# Altium integrated library mod_x_cb_g3399.IntLib: 16 symbols
Pins are listed as number, name and electrical type; pins without a type are passive.

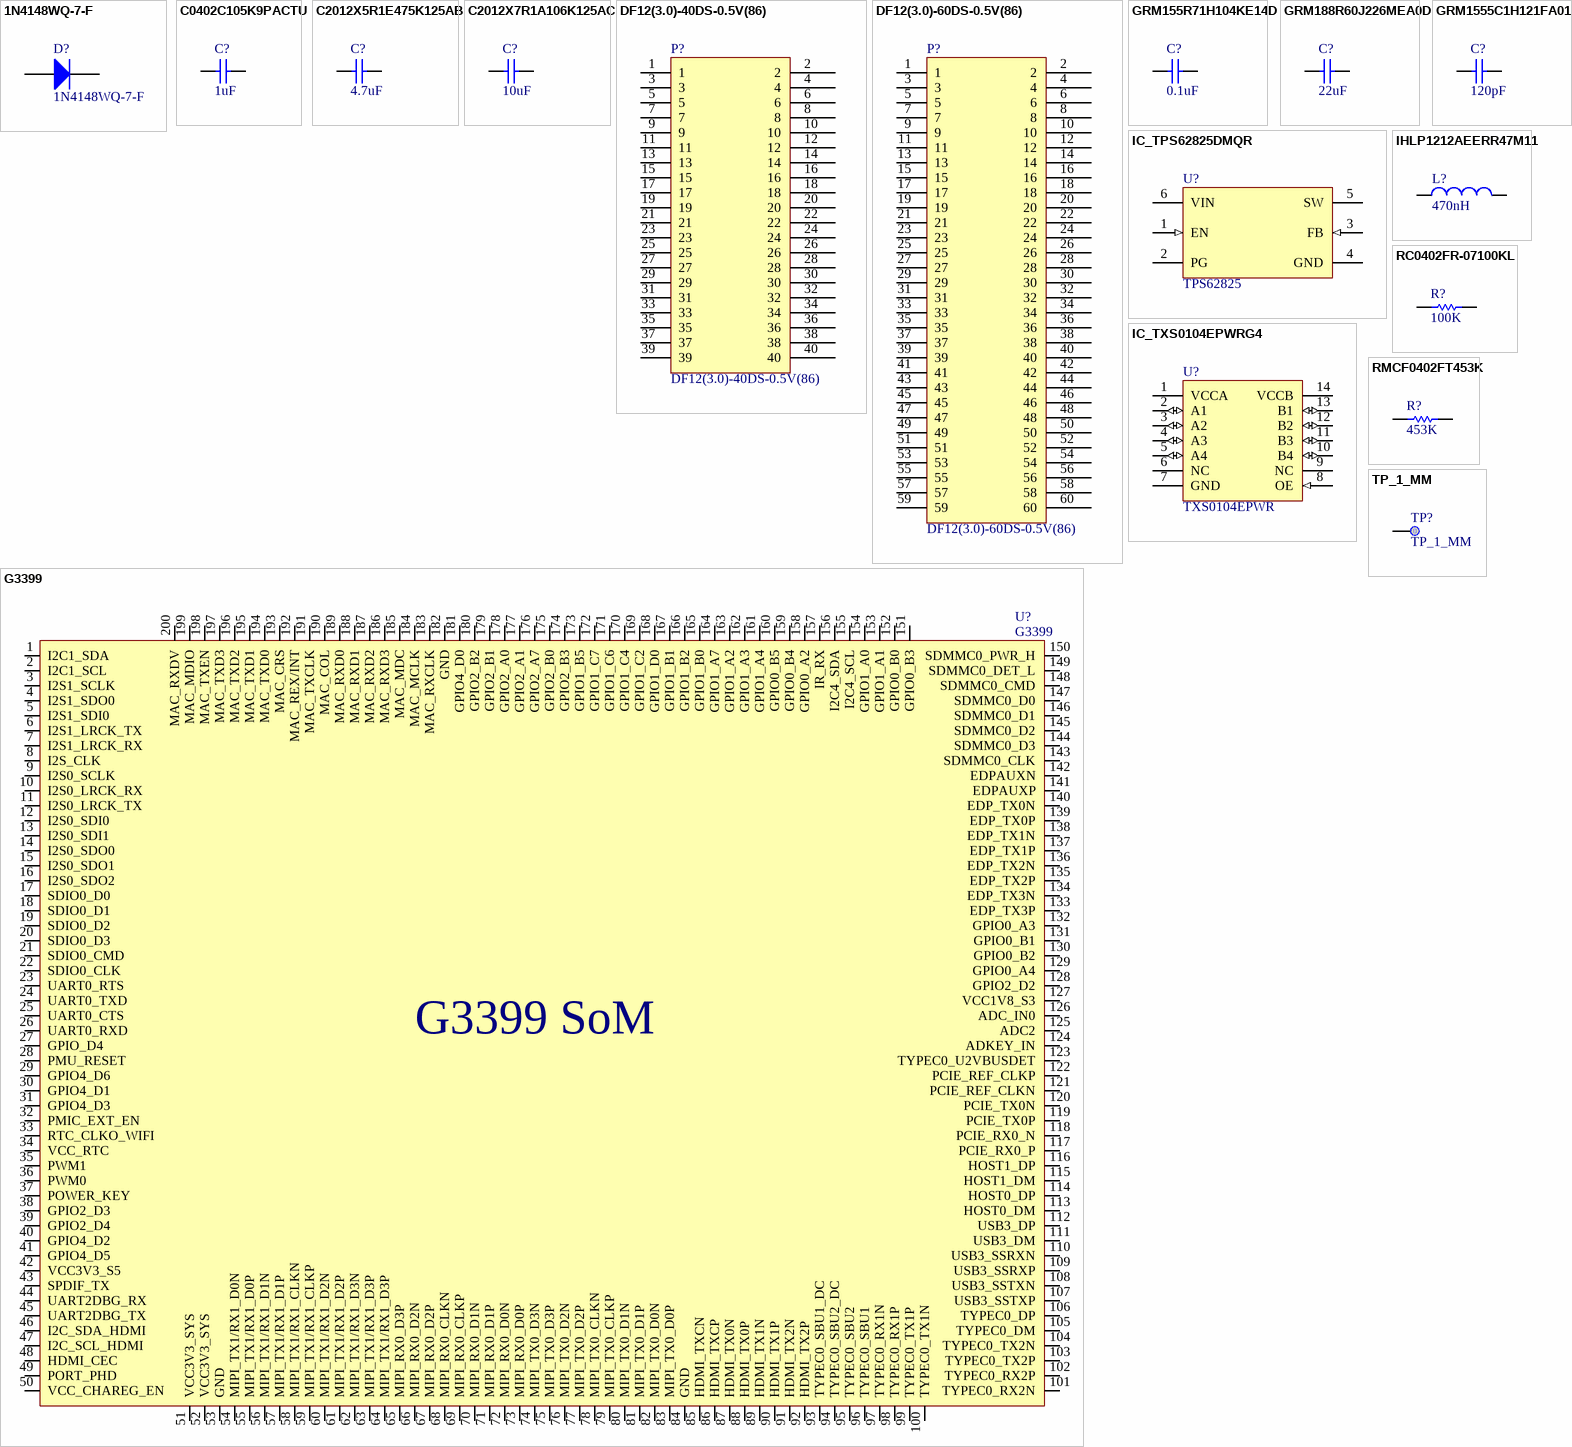
[diagram p0: symbols 1N4148WQ-7-F to TP_1_MM]

## 1N4148WQ-7-F
designator D?
DIODE GEN PURP 100V 300MA SOD123; Manufacturer 1: Diodes Zetex; Max Surge Current: 2A; Forward Voltage: 1.25V; Element Configuration: Single; Recovery Time: 4ns; Peak Reverse Current: 50uA; Max Power Dissipation: 400mW; Supplier 1: Digi-Key; Manufacturer Part Number 1: 1N4148WQ-7-F; Stock 1: 65303; Pricing 1: 1=0.22, 10=0.196, 100=0.107, 500=0.06582, 1000=0.04488 (USD); Mount: Surface Mount; Case/Package: SOD-123-2; Number of Pins: 2; Weight: 0.000353oz; Contact Plating: Matte,Tin; Min Operating Temperature: -65°C; Max Operating Temperature: 150°C; Packaging: Tape and Reel; Peak Non-Repetitive Surge Current: 2A; Forward Current: 300mA; Package Quantity: 3000; Reverse Recovery Time: 4ns; Max Repetitive Reverse Voltage (Vrrm): 100V; Lead Free: Lead Free; Supplier Part Number 1: 1N4148WQ-7-FDICT-ND
footprint SOD123
pins: 1 K, 2 A

## C0402C105K9PACTU
designator C?, comment 1uF
CAP CER 1UF 6.3V X5R 0402; Manufacturer 1: KEMET; Manufacturer Part Number 1: C0402C105K9PACTU; Product Training Modules: Capacitor Basics- Typical Uses for Capacitors; Capacitance: 1µF; Tolerance: ±10%; Online Catalog: X5R Dielectric (Commercial Grade); Kits: 399-5085-ND  - KIT CER HI CAPACITANCE CHIP CAPS; Other Names: 399-4873-1; Supplier 1: Digi-Key; Description 1: CAP CER 1UF 6.3V X5R 0402; Stock 1: 0; Pricing 1: 1=0.1, 10=0.022, 100=0.0097, 500=0.007, 1000=0.0055, 2500=0.005, 5000=0.0046 (USD); Standard Package: 1; Category: Capacitors; Family: Ceramic Capacitors; Series: C; Packaging: Cut Tape (CT); Voltage - Rated: 6.3V; Temperature Coefficient: X5R; Mounting Type: Surface Mount, MLCC; Operating Temperature: -55°C ~ 85°C; Applications: General Purpose; Ratings: -; Package / Case: 0402 (1005 Metric); Size / Dimension: 0.039" L x 0.020" W (1.00mm x 0.50mm); Height - Seated (Max): -; Thickness (Max): 0.022" (0.55mm); Lead Spacing: -; Features: -; Lead Style: -; ComponentLink1URL: https://datasheet.ciiva.com/144/docfinderpartnumber-c0402c105k9pactu-144529.pdf; ComponentLink1Description: https://datasheet.ciiva.com/144/docfinderpartnumber-c0402c105k9pactu-144529.pdf; ComponentLink2URL: https://datasheet.ciiva.com/28645/1789732-28645392.pdf; ComponentLink2Description: https://datasheet.ciiva.com/28645/1789732-28645392.pdf; ComponentLink3URL: https://datasheet.ciiva.com/7747/40889-7747623.pdf; ComponentLink3Description: https://datasheet.ciiva.com/7747/40889-7747623.pdf; ComponentLink4URL: https://datasheet.ciiva.com/18192/getdatasheetpartid-127800-18192427.pdf; ComponentLink4Description: https://datasheet.ciiva.com/18192/getdatasheetpartid-127800-18192427.pdf; ComponentLink5URL: https://datasheet.ciiva.com/7747/kem-c1006-x5r-smd-7747445.pdf; ComponentLink5Description: https://datasheet.ciiva.com/7747/kem-c1006-x5r-smd-7747445.pdf; ComponentLink6URL: https://datasheet.ciiva.com/5414/kem-c1006-x5r-smd-5414919.pdf; ComponentLink6Description: https://datasheet.ciiva.com/5414/kem-c1006-x5r-smd-5414919.pdf; Supplier Part Number 1: 399-4873-1-ND
footprint CAPC1005N (Chip Capacitor, Body 1.0x0.5mm, IPC Medium Density)
footprint CAPC1005L
pins: 1, 2

## C2012X5R1E475K125AB
designator C?, comment 4.7uF
CAP CER 4.7UF 25V X5R 0805; Manufacturer 1: TDK; Manufacturer Part Number 1: C2012X5R1E475K125AB; Dielectric Material: Ceramic; Tolerance: 10%; Supplier 1: Digi-Key; Stock 1: 20000; Pricing 1: 1=0.38, 10=0.259, 100=0.1466, 500=0.1035, 1000=0.09056 (USD); Mount: Surface Mount; Case/Package: 0805; Number of Pins: 2; Weight: 0.000194oz; Case Code (Imperial): 0805; Case Code (Metric): 2012; Min Operating Temperature: -55°C; Max Operating Temperature: 85°C; Capacitance: 4.7uF; Dielectric: X5R; Voltage Rating: 25V; Voltage Rating (DC): 25V; Packaging: Tape and Reel; Package Quantity: 1; Termination: SMD/SMT; Composition: Ceramic; Voltage: 25V; Length: 2mm; Height: 1.25mm; Depth: 1.25mm; Width: 1.25mm; Thickness: 0.057inch; Radiation Hardening: No; REACH SVHC: No SVHC; Lead Free: Lead Free; ComponentLink1URL: https://datasheet.ciiva.com/24216/tdkmlcccaprange-24216480.pdf; ComponentLink1Description: https://datasheet.ciiva.com/24216/tdkmlcccaprange-24216480.pdf; ComponentLink2URL: https://datasheet.ciiva.com/11788/0900766b80c1bb00-11788107.pdf; ComponentLink2Description: https://datasheet.ciiva.com/11788/0900766b80c1bb00-11788107.pdf; ComponentLink3URL: https://datasheet.ciiva.com/36857/1796654-36857301.pdf; ComponentLink3Description: https://datasheet.ciiva.com/36857/1796654-36857301.pdf; ComponentLink4URL: https://datasheet.ciiva.com/22773/1571323-22773430.pdf; ComponentLink4Description: https://datasheet.ciiva.com/22773/1571323-22773430.pdf; ComponentLink5URL: https://datasheet.ciiva.com/6251/tdkmlcccaprange-6251817.pdf; ComponentLink5Description: https://datasheet.ciiva.com/6251/tdkmlcccaprange-6251817.pdf; ComponentLink6URL: https://datasheet.ciiva.com/22676/1571323-22676937.pdf; ComponentLink6Description: https://datasheet.ciiva.com/22676/1571323-22676937.pdf; ComponentLink7URL: https://datasheet.ciiva.com/6251/tdkmlcccaprange-6251820.pdf; ComponentLink7Description: https://datasheet.ciiva.com/6251/tdkmlcccaprange-6251820.pdf; ComponentLink8URL: https://datasheet.ciiva.com/28602/1744655-28602173.pdf; ComponentLink8Description: https://datasheet.ciiva.com/28602/1744655-28602173.pdf; ComponentLink9URL: https://datasheet.ciiva.com/6251/tdkmlcccaprange-6251823.pdf; ComponentLink9Description: https://datasheet.ciiva.com/6251/tdkmlcccaprange-6251823.pdf; ComponentLink10URL: https://datasheet.ciiva.com/16449/e412-c-16449599.pdf; ComponentLink10Description: https://datasheet.ciiva.com/16449/e412-c-16449599.pdf; Supplier Part Number 1: 445-4116-1-ND
footprint CAPC2012N (Chip Capacitor, Body 2.0x1.3mm, IPC Medium Density)
pins: 1, 2

## C2012X7R1A106K125AC
designator C?, comment 10uF
CAP CER 10UF 10V X7R 0805; Manufacturer 1: TDK; Manufacturer Part Number 1: C2012X7R1A106K125AC; Dielectric Material: Ceramic; Tolerance: 10%; Supplier 1: Digi-Key; Stock 1: 20000; Pricing 1: 1=0.52, 10=0.359, 100=0.2156, 500=0.16172, 1000=0.13656 (USD); Mount: Surface Mount; Case/Package: 0805; Number of Pins: 2; Weight: 0.000194oz; Case Code (Metric): 2012; Case Code (Imperial): 0805; Contact Plating: Matte,Tin; Min Operating Temperature: -55°C; Max Operating Temperature: 125°C; Capacitance: 10uF; Dielectric: X7R; Voltage Rating: 10V; Packaging: Tape and Reel; Voltage Rating (DC): 10V; Termination: SMD/SMT; Package Quantity: 1; Composition: Ceramic; Voltage: 10V; Length: 2mm; Height: 1.25mm; Width: 0.049inch; Depth: 1.25mm; Thickness: 0.057inch; Radiation Hardening: No; Lead Free: Lead Free; REACH SVHC: No SVHC; Supplier Part Number 1: 445-6857-1-ND
footprint CAPC2012N (Chip Capacitor, Body 2.0x1.3mm, IPC Medium Density)
pins: 1, 2

## DF12(3.0)-40DS-0.5V(86)
designator P?
CONN RECEPT 40POS 3MM SMD 0.5MM; Manufacturer 1: Hirose; Number of Contacts: 40; Current Rating: 300mA; Voltage Rating: 50V; Gender: Receptacle; Contact Resistance: 50mR; Row Spacing: 2.4mm; Supplier 1: Digi-Key; Manufacturer Part Number 1: DF12(3.0)-40DS-0.5V(86); Stock 1: 9904; Pricing 1: 1=1.44, 10=1.262, 25=1.188, 50=1.1386, 100=1.089, 250=0.99, 500=0.891 (USD); Mount: Surface Mount; Contact Plating: Gold; Contact Material: Copper; Housing Colour: Beige; Housing Material: Polyamide; Insulation Material: Nylon; Min Operating Temperature: -45°C; Max Operating Temperature: 125°C; Number of Rows: 2; Termination: SMD/SMT; Packaging: Tape and Reel; Package Quantity: 1000; Number of Positions: 40; Orientation: Straight; Connector Type: Receptacle; Max Current Rating: 300mA; Max Voltage Rating (AC): 50V; Length: 13mm; Pitch: 0.5mm; Mated Stacking Heights: 3mm; Stack Height: 3mm; Depth: 3.6mm; Radiation Hardening: No; Lead Free: Lead Free; Flammability Rating: UL94 V-0; REACH SVHC: No SVHC; Supplier Part Number 1: H11706CT-ND
footprint DF12-40
pins: 1, 2, 3, 4, 5, 6, 7, 8, 9, 10, 11, 12, 13, 14, 15, 16, 17, 18, 19, 20, 21, 22, 23, 24, 25, 26, 27, 28, 29, 30, 31, 32, 33, 34, 35, 36, 37, 38, 39, 40

## DF12(3.0)-60DS-0.5V(86)
designator P?
CONN RECEPT 60POS 3MM SMD 0.5MM; Manufacturer 1: Hirose; Number of Contacts: 60; Current Rating: 300mA; Voltage Rating: 50V; Gender: Receptacle; Contact Resistance: 50mR; Mating Cycles: 50; Insulation Resistance: 500MR; Row Spacing: 2.4mm; Supplier 1: Digi-Key; Manufacturer Part Number 1: DF12(3.0)-60DS-0.5V(86); Stock 1: 7229; Pricing 1: 1=1.87, 10=1.698, 25=1.594, 50=1.5246, 100=1.4553, 250=1.31672, 500=1.21276 (USD); Mount: Surface Mount; Contact Plating: Gold; Contact Material: Copper,Copper Alloy; Housing Colour: Beige; Housing Material: Polyamide; Insulation Material: Nylon; Colour: Beige; Min Operating Temperature: -45°C; Max Operating Temperature: 125°C; Number of Rows: 2; Termination: Solder; Packaging: Tape and Reel; Package Quantity: 1; Number of Positions: 60; Orientation: Straight; Max Current Rating: 300mA; Max Voltage Rating (AC): 50V; Voltage Rating (AC): 50V; Connector Type: Receptacle; Length: 18mm; Pitch: 0.5mm; Stack Height: 3mm; Mated Stacking Heights: 3mm; Depth: 3.6mm; Lead Pitch: 0.5mm; Width: 18mm; Radiation Hardening: No; Flammability Rating: UL94 V-0; REACH SVHC: No SVHC; Lead Free: Lead Free; Supplier Part Number 1: H5207CT-ND
footprint DF12-60
pins: 1, 2, 3, 4, 5, 6, 7, 8, 9, 10, 11, 12, 13, 14, 15, 16, 17, 18, 19, 20, 21, 22, 23, 24, 25, 26, 27, 28, 29, 30, 31, 32, 33, 34, 35, 36, 37, 38, 39, 40, 41, 42, 43, 44, 45, 46, 47, 48, 49, 50, 51, 52, 53, 54, 55, 56, 57, 58, 59, 60

## G3399
designator U?
ROCKCHIP R3399 SoM
footprint G3399-MOD
pins: 1 I2C1_SDA, 2 I2C1_SCL, 3 I2S1_SCLK, 4 I2S1_SDO0, 5 I2S1_SDI0, 6 I2S1_LRCK_TX, 7 I2S1_LRCK_RX, 8 I2S_CLK, 9 I2S0_SCLK, 10 I2S0_LRCK_RX, 11 I2S0_LRCK_TX, 12 I2S0_SDI0, 13 I2S0_SDI1, 14 I2S0_SDO0, 15 I2S0_SDO1, 16 I2S0_SDO2, 17 SDIO0_D0, 18 SDIO0_D1, 19 SDIO0_D2, 20 SDIO0_D3, 21 SDIO0_CMD, 22 SDIO0_CLK, 23 UART0_RTS, 24 UART0_TXD, 25 UART0_CTS, 26 UART0_RXD, 27 GPIO_D4, 28 PMU_RESET, 29 GPIO4_D6, 30 GPIO4_D1, 31 GPIO4_D3, 32 PMIC_EXT_EN, 33 RTC_CLKO_WIFI, 34 VCC_RTC, 35 PWM1, 36 PWM0, 37 POWER_KEY, 38 GPIO2_D3, 39 GPIO2_D4, 40 GPIO4_D2, 41 GPIO4_D5, 42 VCC3V3_S5, 43 SPDIF_TX, 44 UART2DBG_RX, 45 UART2DBG_TX, 46 I2C_SDA_HDMI, 47 I2C_SCL_HDMI, 48 HDMI_CEC, 49 PORT_PHD, 50 VCC_CHAREG_EN, 51 VCC3V3_SYS, 52 VCC3V3_SYS, 53 GND, 54 MIPI_TX1/RX1_D0N, 55 MIPI_TX1/RX1_D0P, 56 MIPI_TX1/RX1_D1N, 57 MIPI_TX1/RX1_D1P, 58 MIPI_TX1/RX1_CLKN, 59 MIPI_TX1/RX1_CLKP, 60 MIPI_TX1/RX1_D2N, 61 MIPI_TX1/RX1_D2P, 62 MIPI_TX1/RX1_D3N, 63 MIPI_TX1/RX1_D3P, 64 MIPI_TX1/RX1_D3P, 65 MIPI_RX0_D3P, 66 MIPI_RX0_D2N, 67 MIPI_RX0_D2P, 68 MIPI_RX0_CLKN, 69 MIPI_RX0_CLKP, 70 MIPI_RX0_D1N, 71 MIPI_RX0_D1P, 72 MIPI_RX0_D0N, 73 MIPI_RX0_D0P, 74 MIPI_TX0_D3N, 75 MIPI_TX0_D3P, 76 MIPI_TX0_D2N, 77 MIPI_TX0_D2P, 78 MIPI_TX0_CLKN, 79 MIPI_TX0_CLKP, 80 MIPI_TX0_D1N, 81 MIPI_TX0_D1P, 82 MIPI_TX0_D0N, 83 MIPI_TX0_D0P, 84 GND, 85 HDMI_TXCN, 86 HDMI_TXCP, 87 HDMI_TX0N, 88 HDMI_TX0P, 89 HDMI_TX1N, 90 HDMI_TX1P, 91 HDMI_TX2N, 92 HDMI_TX2P, 93 TYPEC0_SBU1_DC, 94 TYPEC0_SBU2_DC, 95 TYPEC0_SBU2, 96 TYPEC0_SBU1, 97 TYPEC0_RX1N, 98 TYPEC0_RX1P, 99 TYPEC0_TX1P, 100 TYPEC0_TX1N, 101 TYPEC0_RX2N, 102 TYPEC0_RX2P, 103 TYPEC0_TX2P, 104 TYPEC0_TX2N, 105 TYPEC0_DM, 106 TYPEC0_DP, 107 USB3_SSTXP, 108 USB3_SSTXN, 109 USB3_SSRXP, 110 USB3_SSRXN, 111 USB3_DM, 112 USB3_DP, 113 HOST0_DM, 114 HOST0_DP, 115 HOST1_DM, 116 HOST1_DP, 117 PCIE_RX0_P, 118 PCIE_RX0_N, 119 PCIE_TX0P, 120 PCIE_TX0N, 121 PCIE_REF_CLKN, 122 PCIE_REF_CLKP, 123 TYPEC0_U2VBUSDET, 124 ADKEY_IN, 125 ADC2, 126 ADC_IN0, 127 VCC1V8_S3, 128 GPIO2_D2, 129 GPIO0_A4, 130 GPIO0_B2, 131 GPIO0_B1, 132 GPIO0_A3, 133 EDP_TX3P, 134 EDP_TX3N, 135 EDP_TX2P, 136 EDP_TX2N, 137 EDP_TX1P, 138 EDP_TX1N, 139 EDP_TX0P, 140 EDP_TX0N, 141 EDPAUXP, 142 EDPAUXN, 143 SDMMC0_CLK, 144 SDMMC0_D3, 145 SDMMC0_D2, 146 SDMMC0_D1, 147 SDMMC0_D0, 148 SDMMC0_CMD, 149 SDMMC0_DET_L, 150 SDMMC0_PWR_H, 151 GPIO0_B3, 152 GPIO0_B0, 153 GPIO1_A1, 154 GPIO1_A0, 155 I2C4_SCL, 156 I2C4_SDA, 157 IR_RX, 158 GPIO0_A2, 159 GPIO0_B4, 160 GPIO0_B5, 161 GPIO1_A4, 162 GPIO1_A3, 163 GPIO1_A2, 164 GPIO1_A7, 165 GPIO1_B0, 166 GPIO1_B2, 167 GPIO1_B1, 168 GPIO1_D0, 169 GPIO1_C2, 170 GPIO1_C4, 171 GPIO1_C6, 172 GPIO1_C7, 173 GPIO1_B5, 174 GPIO2_B3, 175 GPIO2_B0, 176 GPIO2_A7, 177 GPIO2_A1, 178 GPIO2_A0, 179 GPIO2_B1, 180 GPIO2_B2, 181 GPIO4_D0, 182 GND, 183 MAC_RXCLK, 184 MAC_MCLK, 185 MAC_MDC, 186 MAC_RXD3, 187 MAC_RXD2, 188 MAC_RXD1, 189 MAC_RXD0, 190 MAC_COL, 191 MAC_TXCLK, 192 MAC_REX/INT, 193 MAC_CRS, 194 MAC_TXD0, 195 MAC_TXD1, 196 MAC_TXD2, 197 MAC_TXD3, 198 MAC_TXEN, 199 MAC_MDIO, 200 MAC_RXDV
text: G3399 SoM

## GRM155R71H104KE14D
designator C?, comment 0.1uF
CAP CER 0.1UF 50V X7R 0402; Manufacturer 1: Murata; Manufacturer Part Number 1: GRM155R71H104KE14D; Description 1: Cap Ceramic 0.1uF 50V X7R 10% SMD 0402 125C Paper T/R; Voltage Rating DC: 50 VDC; Tolerance: 10 %; Brand: Murata Electronics; Capacitance - nF: 100 nF; Capacitance - pF: 100000 pF; Class: Class 2; Type: General Purpose Ceramic Capacitors; Unit Weight: 0.000212 oz; Supplier 1: Digi-Key; Stock 1: 0; Pricing 1: 1=0.1, 10=0.022, 100=0.0099, 500=0.0071, 1000=0.0056, 2500=0.0051, 5000=0.0047 (USD); Product Category: Multilayer Ceramic Capacitors MLCC - SMD/SMT; RoHS: True; Capacitance: 0.1 uF; Dielectric: X7R; Case Code - in: 0402; Case Code - mm: 1005; Height: 0.5 mm; Maximum Operating Temperature: + 125 C; Minimum Operating Temperature: - 55 C; Product: General Type MLCCs; Series: GRM; Packaging: Reel; Length: 1 mm; Package / Case: 0402 (1005 metric); Factory Pack Quantity: 10000; Termination Style: SMD/SMT; Width: 0.5 mm; ComponentLink1URL: http://components.arrow.com/part/dataview/0323_07030614; ComponentLink1Description: http://components.arrow.com/part/dataview/0323_07030614; ComponentLink2URL: http://psearch.en.murata.com/capacitor/product/GRM155R71H104KE14%23.pdf; ComponentLink2Description: http://psearch.en.murata.com/capacitor/product/GRM155R71H104KE14%23.pdf; ComponentLink3URL: http://www.mouser.com/ds/2/281/c02e-2905.pdf; ComponentLink3Description: http://www.mouser.com/ds/2/281/c02e-2905.pdf; ComponentLink4URL: http://search.murata.co.jp/Ceramy/image/img/A01X/partnumbering_e_01.pdf; ComponentLink4Description: http://search.murata.co.jp/Ceramy/image/img/A01X/partnumbering_e_01.pdf; ComponentLink5URL: http://www.farnell.com/datasheets/2079156.pdf; ComponentLink5Description: http://www.farnell.com/datasheets/2079156.pdf; Supplier Part Number 1: 490-10700-1-ND
footprint CAPC1005N (Chip Capacitor, Body 1.0x0.5mm, IPC Medium Density)
pins: 1, 2

## GRM188R60J226MEA0D
designator C?, comment 22uF
CAP CER 22UF 6.3V X5R 0603; Manufacturer 1: Murata; Manufacturer Part Number 1: GRM188R60J226MEA0D; Tolerance: 20%; Supplier 1: Digi-Key; Stock 1: 40000; Pricing 1: 1=0.26, 10=0.177, 100=0.1001, 500=0.07066, 1000=0.06182 (USD); Mount: Surface Mount; Case/Package: 0603; Weight: 0.000222oz; Case Code (Metric): 1608; Case Code (Imperial): 0603; Min Operating Temperature: -55°C; Max Operating Temperature: 85°C; Capacitance: 22uF; Packaging: Tape and Reel; Package Quantity: 4000; Voltage Rating: 6.3V; Dielectric: X5R; Termination: SMD/SMT; Voltage Rating (DC): 6.3V; Length: 1.6mm; Height: 0.8mm; Width: 0.8mm; Thickness: 0.039inch; Depth: 0.8mm; REACH SVHC: No SVHC; Lead Free: Lead Free; ComponentLink1URL: https://www.murata.com/~/media/webrenewal/support/library/catalog/products/capacitor/mlcc/c02e.ashx?la=en-us; ComponentLink1Description: https://www.murata.com/~/media/webrenewal/support/library/catalog/products/capacitor/mlcc/c02e.ashx?la=en-us; Supplier Part Number 1: 490-7611-1-ND
footprint CAPC1608N (Chip Capacitor, Body 1.6x0.8mm, IPC Medium Density)
footprint CAPC1608L (Chip Capacitor, Body 1.6x0.8mm, IPC High Density)
pins: 1, 2

## GRM1555C1H121FA01D
designator C?, comment 120pF
CAP CER 120PF 50V C0G/NP0 0402; Manufacturer 1: Murata; Manufacturer Part Number 1: GRM1555C1H121FA01D; Description 1: Multilayer Ceramic Capacitors MLCC - SMD/SMT 0402 120pF 50volts 1%; Brand: Murata Electronics; Tolerance: 1 %; Dielectric: C0G (NP0); Case Height: 0.5 mm; Case Length: 1 mm; Temperature Coefficient / Code: +/- 30 PPM / C; Type: General Purpose MLCC; Material: Ceramic; Temperature Coefficient: 30ppm/°C; Supplier 1: Digi-Key; Stock 1: 154558; Pricing 1: 1=0.15, 10=0.107, 100=0.0501, 500=0.0351, 1000=0.0291, 2500=0.0271, 5000=0.0248 (USD); Voltage Rating: 50 V; Product Category: Multilayer Ceramic Capacitors MLCC - SMD/SMT; RoHS: Details; Capacitance: 120 pF; Voltage Rating DC: 50 V; Case Code - in: 0402; Case Code - mm: 1005; Minimum Operating Temperature: - 55 C; Maximum Operating Temperature: + 125 C; Product: General Type MLCCs; Case Width: 0.5 mm; Operating Temperature Range: - 55 C to + 125 C; Package / Case: 0402 (1005 metric); Packaging: Reel; Series: GRM; Factory Pack Quantity: 10000; Termination Style: SMD/SMT; Dimensions: 0.5 mm W x 1 mm L x 0.5 mm H; ComponentLink1URL: https://datasheet.ciiva.com/11617/c02e-11617455.pdf; ComponentLink1Description: https://datasheet.ciiva.com/11617/c02e-11617455.pdf; ComponentLink2URL: https://datasheet.ciiva.com/17451/c02e-17451502.pdf; ComponentLink2Description: https://datasheet.ciiva.com/17451/c02e-17451502.pdf; Supplier Part Number 1: 490-8182-1-ND; Supplier 2: Digi-Key; Manufacturer 2: Murata; Manufacturer Part Number 2: GRM1555C1H121JA01D; Stock 2: 100000; Pricing 2: 1=0.1, 10=0.065, 100=0.0289, 500=0.02066, 1000=0.01623, 2500=0.01475, 5000=0.01357 (USD); Mount: Surface Mount; Case/Package: 0402; Case Code (Imperial): 0402; Case Code (Metric): 1005; Min Operating Temperature: -55°C; Max Operating Temperature: 125°C; Voltage Rating (DC): 50V; Package Quantity: 1; Termination: SMD/SMT; Voltage: 50V; Length: 1mm; Height: 0.5mm; Width: 0.5mm; Thickness: 0.022inch; Depth: 0.5mm; Radiation Hardening: No; REACH SVHC: No SVHC; Lead Free: Lead Free; Supplier Part Number 2: 490-1292-1-ND
footprint CAPC1005N (Chip Capacitor, Body 1.0x0.5mm, IPC Medium Density)
pins: 1, 2

## IC_TPS62825DMQR
designator U?, comment TPS62825
IC STEP DOWN CONV 1-5V 2A QFN; Manufacturer 1: Texas Instruments; Manufacturer Part Number 1: TPS62825DMQR; Supplier 1: Digi-Key; Stock 1: 1427; Pricing 1: 1=1.56, 10=1.392, 100=1.085, 500=0.8963, 1000=0.70761 (USD); Supplier Part Number 1: 296-49521-1-ND
footprint DMQ0006A
pins: 1 EN (in), 2 PG (oc), 3 FB (in), 4 GND (power), 5 SW (power), 6 VIN (power)

## IC_TXS0104EPWRG4
designator U?, comment TXS0104EPWR
IC TRNSLTR BIDIRECTIONAL 14TSSOP; Manufacturer 1: Texas Instruments; Manufacturer Part Number 1: TXS0104EPWRG4; Max Supply Voltage: 5.5V; Min Supply Voltage: 2.3V; Propagation Delay: 260ns; Data Rate: 24Mbps; Number of Channels: 4; Logic Function: Translator; High Level Output Current: -20uA; Low Level Output Current: 1mA; Quiescent Current: 14.4uA; Output Type: Voltage; Supplier 1: Digi-Key; Stock 1: 1124; Pricing 1: 1=1.35000, 10=1.20300, 100=0.93810, 500=0.77498, 1000=0.61182 (USD); RoHS: Yes; Mount: Surface Mount; Case/Package: TSSOP; Number of Pins: 14; Weight: 0.002018oz; Min Operating Temperature: -40°C; Max Operating Temperature: 85°C; Packaging: Tape and Reel; Package Quantity: 2000; Number of Bits: 4; Turn-On Delay Time: 260ns; Length: 5mm; Height: 1.15mm; Width: 4.4mm; Radiation Hardening: No; Lead Free: Lead Free; ComponentLink1URL: https://datasheet.ciiva.com/4834/sces651d-126957-4834816.pdf?src-supplier=Mouser; ComponentLink1Description: https://datasheet.ciiva.com/4834/sces651d-126957-4834816.pdf?src-supplier=Mouser; ComponentLink2URL: https://datasheet.ciiva.com/15096/getdatasheetpartid-394723-15096293.pdf?src-supplier=Verical; ComponentLink2Description: https://datasheet.ciiva.com/15096/getdatasheetpartid-394723-15096293.pdf?src-supplier=Verical; ComponentLink3URL: https://datasheet.ciiva.com/26039/txs0104e-26039590.pdf?src-supplier=Avnet+Europe; ComponentLink3Description: https://datasheet.ciiva.com/26039/txs0104e-26039590.pdf?src-supplier=Avnet+Europe; ComponentLink4URL: https://datasheet.ciiva.com/14287/txs0104e-14287679.pdf?src-supplier=Avnet; ComponentLink4Description: https://datasheet.ciiva.com/14287/txs0104e-14287679.pdf?src-supplier=Avnet; ComponentLink5URL: https://datasheet.ciiva.com/1900/txs0104e-1900897.pdf?src-supplier=Digi-Key; ComponentLink5Description: https://datasheet.ciiva.com/1900/txs0104e-1900897.pdf?src-supplier=Digi-Key; Supplier Part Number 1: 296-52841-1-ND
footprint TSSOP_PW14
pins: 1 VCCA (power), 2 A1 (io), 3 A2 (io), 4 A3 (io), 5 A4 (io), 6 NC (power), 7 GND (power), 8 OE (in), 9 NC (power), 10 B4 (io), 11 B3 (io), 12 B2 (io), 13 B1 (io), 14 VCCB (power)

## IHLP1212AEERR47M11
designator L?, comment 470nH
FIXED IND 470NH 6.7A 15 MOHM SMD; Manufacturer 1: Vishay Dale; Manufacturer Part Number 1: IHLP1212AEERR47M11; Core Material: Ferrite; Tolerance: 20%; Self Resonant Frequency: 1MHz; Shielding: Shielded; DC Resistance (DCR): 15mR; Test Frequency: 100kHz; Supplier 1: Digi-Key; Stock 1: 27366; Pricing 1: 1=1.41, 10=1.308, 100=0.9459, 500=0.7245, 1000=0.644 (USD); Mount: Surface Mount; Case/Package: 1212; Number of Pins: 2; Min Operating Temperature: -55°C; Max Operating Temperature: 125°C; Packaging: Tape and Reel; Inductance Tolerance: 20%; Package Quantity: 3000; Current Rating: 6.7A; Saturation Current: 6.7A; Inductance: 470nh; Max DC Current: 6.7A; Termination: SMD/SMT; RMS Current (Irms): 6.7A; Military Standard: Not; Length: 3.6mm; Height: 1.2mm; Width: 3mm; Height - Seated (Max): 0.059inch; Depth: 3.2mm; Radiation Hardening: No; REACH SVHC: Unknown; Lead Free: Lead Free; Supplier Part Number 1: 541-1330-1-ND
footprint IHLP-1212AE-11
pins: 1, 2

## RC0402FR-07100KL
designator R?, comment 100K
RES SMD 100K OHM 1% 1/16W 0402; Manufacturer 1: Yageo; Manufacturer Part Number 1: RC0402FR-07100KL; Resistance: 100 kOhms; Power Rating: 62.5 mW (1/16 W); Voltage Rating: 50 V; Temperature Coefficient: 100 PPM / C; Supplier 1: Digi-Key; Description 1: RES SMD 100K OHM 1% 1/16W 0402; Stock 1: 10691398; Pricing 1: 1=0.1, 10=0.014, 100=0.0056, 1000=0.0025, 2500=0.0022, 5000=0.0018 (USD); Termination Style: SMD/SMT; Product: Thick Film Resistors General Purpose; Tolerance: 1 %; Case Code - in: 0402; Case Code - mm: 1005; Series: RC; Operating Temperature Range: - 55 C to + 155 C; Packaging: Reel; ComponentLink1URL: https://datasheet.ciiva.com/11819/0900766b80c66297-11819452.pdf; ComponentLink1Description: https://datasheet.ciiva.com/11819/0900766b80c66297-11819452.pdf; ComponentLink2URL: https://datasheet.ciiva.com/16740/pyu-rc0402-51-rohs-l-6-r-16740567.pdf; ComponentLink2Description: https://datasheet.ciiva.com/16740/pyu-rc0402-51-rohs-l-6-r-16740567.pdf; ComponentLink3URL: https://datasheet.ciiva.com/12667/pyu-rc0402-51-rohs-l-6-r-12667930.pdf; ComponentLink3Description: https://datasheet.ciiva.com/12667/pyu-rc0402-51-rohs-l-6-r-12667930.pdf; ComponentLink4URL: https://datasheet.ciiva.com/2453/pyu-r-int-thick-7-2453361.pdf; ComponentLink4Description: https://datasheet.ciiva.com/2453/pyu-r-int-thick-7-2453361.pdf; ComponentLink5URL: https://datasheet.ciiva.com/15189/getdatasheetpartid-323696-15189334.pdf; ComponentLink5Description: https://datasheet.ciiva.com/15189/getdatasheetpartid-323696-15189334.pdf; ComponentLink6URL: https://datasheet.ciiva.com/2453/pyu-r-int-thick-7-2453362.pdf; ComponentLink6Description: https://datasheet.ciiva.com/2453/pyu-r-int-thick-7-2453362.pdf; ComponentLink7URL: https://datasheet.ciiva.com/2453/pyu-r-int-thick-7-2453363.pdf; ComponentLink7Description: https://datasheet.ciiva.com/2453/pyu-r-int-thick-7-2453363.pdf; ComponentLink8URL: https://datasheet.ciiva.com/22747/1018594-22747509.pdf; ComponentLink8Description: https://datasheet.ciiva.com/22747/1018594-22747509.pdf; Supplier Part Number 1: 311-100KLRCT-ND
footprint RESC1005N (Chip Resistor, Body 1.1x0.5mm, IPC Medium Density)
pins: 1, 2

## RMCF0402FT453K
designator R?, comment 453K
RES SMD 453K OHM 1% 1/16W 0402; Manufacturer: Stackpole Electronics; Manufacturer Part Number: RMCF0402FT453K; Resistance: 453kR; Max Power Dissipation: 63mW; Temperature Coefficient: 100ppm/°C; Supplier 1: Digi-Key; Stock 1: 49261; Pricing 1: 1=0.10000, 10=0.01500, 100=0.00610, 1000=0.00275, 2500=0.00239, 5000=0.00198 (USD); RoHS: Yes; Mount: Surface Mount; Case/Package: 0402; Case Code (Metric): 1005; Case Code (Imperial): 0402; Contact Plating: Tin,Matte; Min Operating Temperature: -55°C; Max Operating Temperature: 155°C; Tolerance: 1%; Packaging: Tape and Reel; Composition: Thick Film; Number of Terminations: 2; Features: Automotive AEC-Q200; Length: 0.039inch; Height: 0.016inch; Width: 0.02inch; ComponentLink1URL: https://www.seielect.com/catalog/SEI-Packaging.pdf?src-supplier=Digi-Key; ComponentLink1Description: https://www.seielect.com/catalog/SEI-Packaging.pdf?src-supplier=Digi-Key; ComponentLink2URL: http://components.arrow.com/part/dataview/47827349S9775272N1174?src-supplier=Arrow; ComponentLink2Description: http://components.arrow.com/part/dataview/47827349S9775272N1174?src-supplier=Arrow; ComponentLink3URL: https://www.seielect.com/Catalog/SEI-RMCF_RMCP.pdf?src-supplier=Avnet; ComponentLink3Description: https://www.seielect.com/Catalog/SEI-RMCF_RMCP.pdf?src-supplier=Avnet; Supplier Part Number 1: RMCF0402FT453KCT-ND
footprint RESC1005L
footprint RESC1005N (Chip Resistor, Body 1.1x0.5mm, IPC Medium Density)
pins: 1, 2

## TP_1_MM
designator TP?  (no BOM)
footprint TP_1_MM
pins: 1